# Altium footprint library ICs And Semiconductors SMD.PcbLib: 602 footprints (part 35 of 38)
Each footprint in its own frame and in the unit in brackets; x right, y up, seen from the top. Pads: shape width x height; smd on the part's side, far side on the other; paste and mask are expansions set on the pad; w line width, h text height; cw(c..) or ccw(c..) is an arc to the next point about the centre after c.
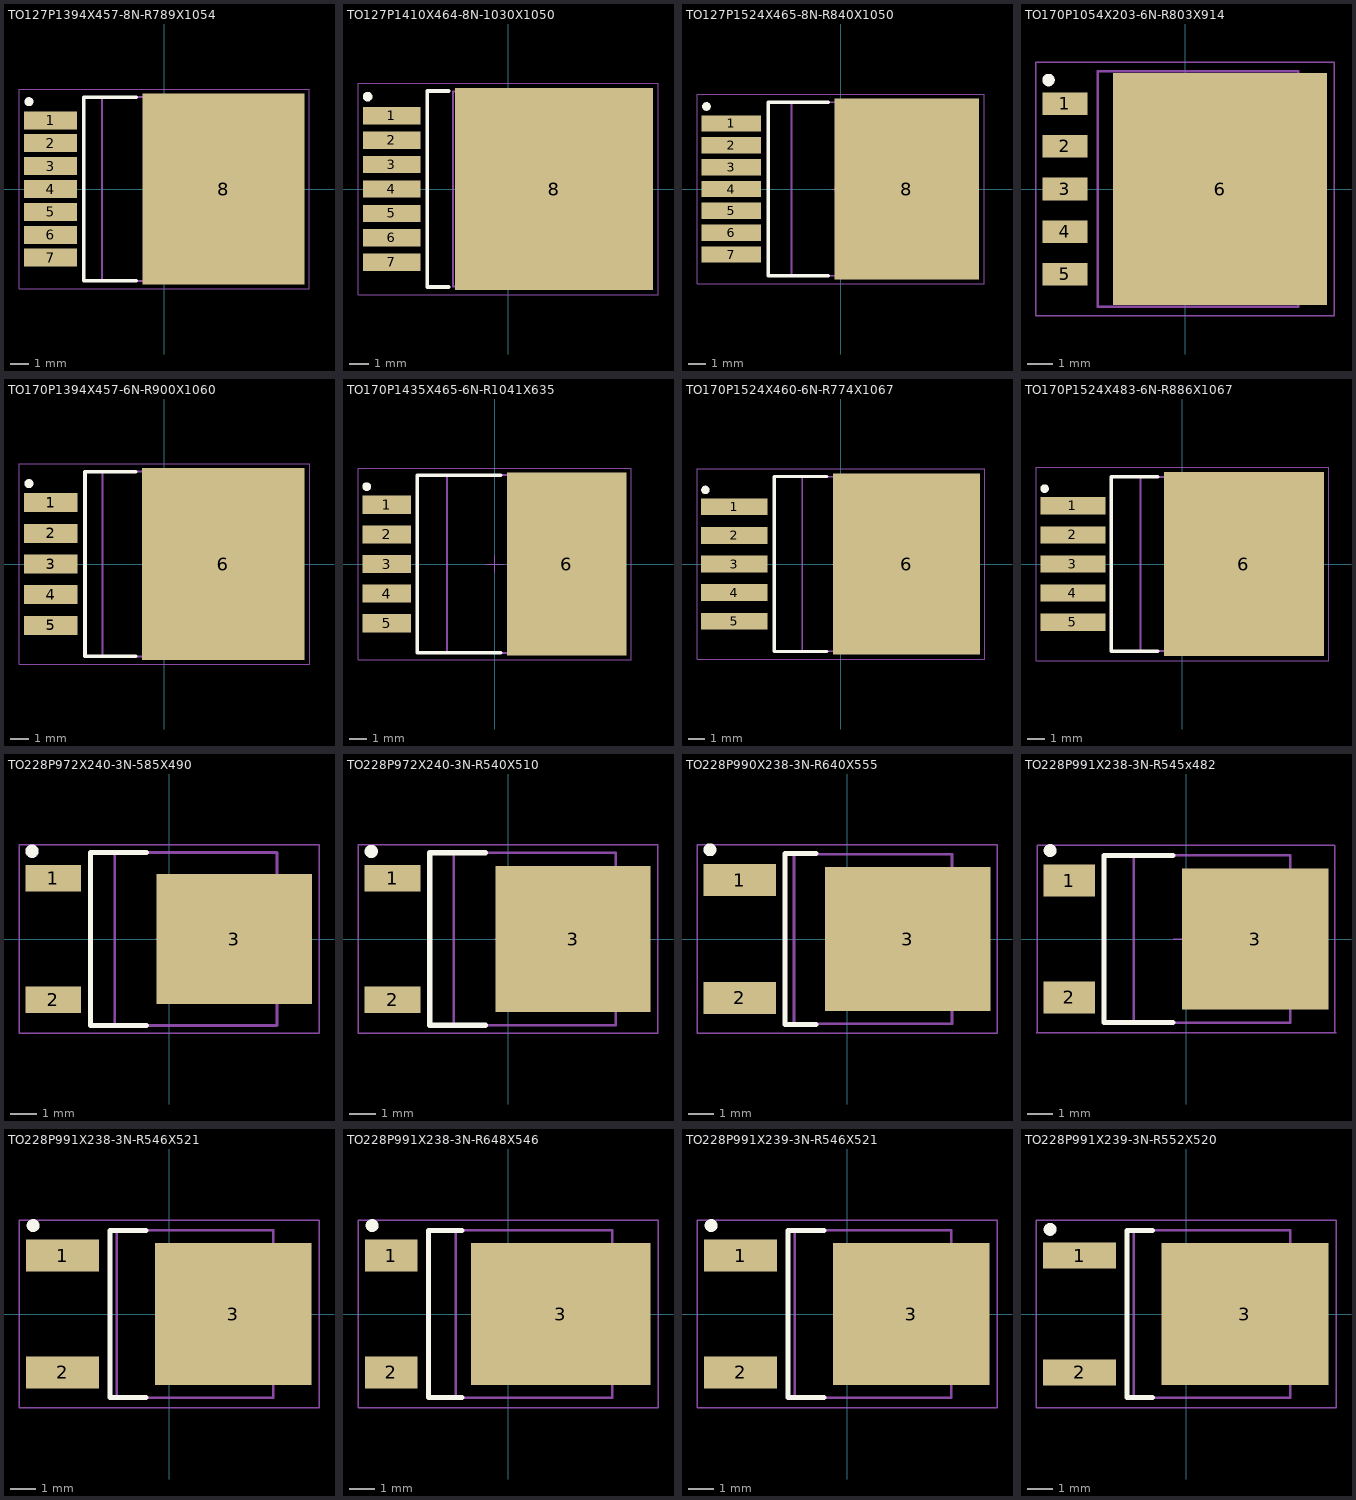
[diagram p34: the footprints below, top view; thin cyan lines are the x and y axes]

## TO127P1394X457-8N-R789X1054 [mm] "TO-263, 7 Leads, 1.70mm pitch; TO, 13.945mm L X 8.89mm W X 4.57mm H body IPC Medium Density"
height 4.57
pads (8):
  rect 2.95x1 smd: 1(-6.3,3.81) 2(-6.3,2.54) 3(-6.3,1.27) 4(-6.3,0) 5(-6.3,-1.27) 6(-6.3,-2.54) 7(-6.3,-3.81)
  rect 9x10.6 smd: 8(3.3,0)
Top Overlay:
  circle w0.25: c-7.5,4.85 r0.125
  lines w0.2: -1.55,-5.1 -4.45,-5.1 -4.45,5.1 -1.55,5.1
Top Paste:
  region: 5.74,3.3 7.1,3.3 7.1,4.7 5.74,4.7
  region: 3.66,3.3 5.02,3.3 5.02,4.7 3.66,4.7
  region: 1.58,3.3 2.94,3.3 2.94,4.7 1.58,4.7
  region: -0.5,3.3 0.86,3.3 0.86,4.7 -0.5,4.7
  region: 5.74,1.3 7.1,1.3 7.1,2.7 5.74,2.7
  region: 3.66,1.3 5.02,1.3 5.02,2.7 3.66,2.7
  region: 1.58,1.3 2.94,1.3 2.94,2.7 1.58,2.7
  region: -0.5,1.3 0.86,1.3 0.86,2.7 -0.5,2.7
  region: 5.74,-0.7 7.1,-0.7 7.1,0.7 5.74,0.7
  region: 3.66,-0.7 5.02,-0.7 5.02,0.7 3.66,0.7
  region: 1.58,-0.7 2.94,-0.7 2.94,0.7 1.58,0.7
  region: -0.5,-0.7 0.86,-0.7 0.86,0.7 -0.5,0.7
  region: 5.74,-2.7 7.1,-2.7 7.1,-1.3 5.74,-1.3
  region: 3.66,-2.7 5.02,-2.7 5.02,-1.3 3.66,-1.3
  region: 1.58,-2.7 2.94,-2.7 2.94,-1.3 1.58,-1.3
  region: -0.5,-2.7 0.86,-2.7 0.86,-1.3 -0.5,-1.3
  region: 5.74,-4.7 7.1,-4.7 7.1,-3.3 5.74,-3.3
  region: 3.66,-4.7 5.02,-4.7 5.02,-3.3 3.66,-3.3
  region: 1.58,-4.7 2.94,-4.7 2.94,-3.3 1.58,-3.3
  region: -0.5,-4.7 0.86,-4.7 0.86,-3.3 -0.5,-3.3
Mechanical 14:
  lines w0.1: 5.452,-5.112 5.954,-5.112 6.972,-3.984 6.972,3.985 5.954,5.113 5.452,5.113 ; -3.438,-5.11 -3.438,5.11 5.453,5.11 5.453,-5.11 -3.438,-5.11
Mechanical 15:
  lines w0.05: -0.5,0 0.5,0 ; 0,-0.5 0,0.5 ; -8.05,-5.55 -8.05,5.55 8.05,5.55 8.05,-5.55 -8.05,-5.55
3D body "TO127P1394X457-8N-R789X1054.stp": height 4.57, standoff 0, extent -7.068,-5.27 7.486,5.271

## TO127P1410X464-8N-1030X1050 [mm] "TO-263, TO,1.27mm pitch;7 pin,14.10mm L X 8.64mm W X 4.64mm H body, IPC Medium Density"
height 4.64
pads (8):
  rect 3x0.9 smd: 1(-6.05,3.81) 2(-6.05,2.54) 3(-6.05,1.27) 4(-6.05,0) 5(-6.05,-1.27) 6(-6.05,-2.54) 7(-6.05,-3.81)
  rect 10.3x10.5 smd: 8(2.4,0)
Top Overlay:
  circle w0.25: c-7.3,4.8 r0.125
  lines w0.2: -3.1,-5.1 -4.2,-5.1 -4.2,5.1 -3.1,5.1
Top Paste:
  region: -1.98,-4.63 -0.36,-4.63 -0.36,-3.29 -1.98,-3.29
  region: 0.4,-4.63 2.02,-4.63 2.02,-3.29 0.4,-3.29
  region: 2.78,-4.63 4.4,-4.63 4.4,-3.29 2.78,-3.29
  region: 5.16,-4.63 6.78,-4.63 6.78,-3.29 5.16,-3.29
  region: -1.98,-2.65 -0.36,-2.65 -0.36,-1.31 -1.98,-1.31
  region: 0.4,-2.65 2.02,-2.65 2.02,-1.31 0.4,-1.31
  region: 2.78,-2.65 4.4,-2.65 4.4,-1.31 2.78,-1.31
  region: 5.16,-2.65 6.78,-2.65 6.78,-1.31 5.16,-1.31
  region: -1.98,-0.67 -0.36,-0.67 -0.36,0.67 -1.98,0.67
  region: 0.4,-0.67 2.02,-0.67 2.02,0.67 0.4,0.67
  region: 2.78,-0.67 4.4,-0.67 4.4,0.67 2.78,0.67
  region: 5.16,-0.67 6.78,-0.67 6.78,0.67 5.16,0.67
  region: -1.98,1.31 -0.36,1.31 -0.36,2.65 -1.98,2.65
  region: 0.4,1.31 2.02,1.31 2.02,2.65 0.4,2.65
  region: 2.78,1.31 4.4,1.31 4.4,2.65 2.78,2.65
  region: 5.16,1.31 6.78,1.31 6.78,2.65 5.16,2.65
  region: -1.98,3.29 -0.36,3.29 -0.36,4.63 -1.98,4.63
  region: 0.4,3.29 2.02,3.29 2.02,4.63 0.4,4.63
  region: 2.78,3.29 4.4,3.29 4.4,4.63 2.78,4.63
  region: 5.16,3.29 6.78,3.29 6.78,4.63 5.16,4.63
Mechanical 14:
  lines w0.1: 5.78,-5.112 6.199,-5.112 7.05,-4.17 7.05,4.17 6.199,5.112 5.78,5.112 ; -2.86,-5.08 5.78,-5.08 5.78,5.08 -2.86,5.08 -2.86,-5.08
Mechanical 15:
  circle w0.05: c0,0 r0.35
  lines w0.05: -0.5,0 0.5,0 ; 0,-0.5 0,0.5 ; -7.8,-5.5 7.8,-5.5 7.8,5.5 -7.8,5.5 -7.8,-5.5
3D body "TO127P1410X464-8N-1030X1050.stp": height 4.57, standoff 0, extent -7.124,-5.08 7.232,5.08

## TO127P1524X465-8N-R840X1050 [mm] "TO, 1.27mm Pitch; 7 Pin, 15.24mm L X 8.89mm W X 4.65mm H Body, IPC Medium Density"
height 4.65
pads (8):
  rect 3.45x0.95 smd: 1(-6.35,3.81) 2(-6.35,2.54) 3(-6.35,1.27) 4(-6.35,0) 5(-6.35,-1.27) 6(-6.35,-2.54) 7(-6.35,-3.81)
  rect 8.4x10.5 smd: 8(3.85,0)
Top Overlay:
  circle w0.25: c-7.8,4.8 r0.125
  lines w0.2: -0.7,-5.05 -4.2,-5.05 -4.2,5.05 -0.7,5.05
Top Paste:
  region: 5.54,3.25 7.2,3.25 7.2,4.67 5.54,4.67
  region: 3.02,3.25 4.68,3.25 4.68,4.67 3.02,4.67
  region: 0.5,3.25 2.16,3.25 2.16,4.67 0.5,4.67
  region: 5.54,1.27 7.2,1.27 7.2,2.69 5.54,2.69
  region: 3.02,1.27 4.68,1.27 4.68,2.69 3.02,2.69
  region: 0.5,1.27 2.16,1.27 2.16,2.69 0.5,2.69
  region: 5.54,-0.71 7.2,-0.71 7.2,0.71 5.54,0.71
  region: 3.02,-0.71 4.68,-0.71 4.68,0.71 3.02,0.71
  region: 0.5,-0.71 2.16,-0.71 2.16,0.71 0.5,0.71
  region: 5.54,-2.69 7.2,-2.69 7.2,-1.27 5.54,-1.27
  region: 3.02,-2.69 4.68,-2.69 4.68,-1.27 3.02,-1.27
  region: 0.5,-2.69 2.16,-2.69 2.16,-1.27 0.5,-1.27
  region: 5.54,-4.67 7.2,-4.67 7.2,-3.25 5.54,-3.25
  region: 3.02,-4.67 4.68,-4.67 4.68,-3.25 3.02,-3.25
  region: 0.5,-4.67 2.16,-4.67 2.16,-3.25 0.5,-3.25
Mechanical 14:
  lines w0.1: 6.04,5.047 6.561,5.047 7.62,3.874 7.62,-3.875 6.561,-5.048 6.04,-5.048 ; 6.04,-5.048 6.04,5.048 -2.85,5.048 -2.85,-5.048 6.04,-5.048
Mechanical 15:
  circle w0.05: c0,0 r0.35
  lines w0.05: -0.5,0 0.5,0 ; 0,-0.5 0,0.5 ; -8.35,-5.5 -8.35,5.5 8.35,5.5 8.35,-5.5 -8.35,-5.5
3D body "TO127P1524X465-8N-R840X1050.stp": height 4.65, standoff 0, extent -7.685,-5.205 7.685,5.205

## TO170P1054X203-6N-R803X914 [mm] "TO, 1.70mm Pitch; 5 Pin,10.54mm L X 8.00mm W X 2.03mm H body, IPC Medium Density"
height 2.03
pads (6):
  rect 1.8x0.9 smd: 1(-4.8,3.4) 2(-4.8,1.7) 3(-4.8,0) 4(-4.8,-1.7) 5(-4.8,-3.4)
  rect 8.55x9.25 smd: 6(1.4,0)
Top Overlay:
  circle w0.25: c-5.45,4.35 r0.125
Top Paste:
  region: -2.23,-3.99 -0.91,-3.99 -0.91,-2.49 -2.23,-2.49
  region: -0.25,-3.99 1.07,-3.99 1.07,-2.49 -0.25,-2.49
  region: 1.73,-3.99 3.05,-3.99 3.05,-2.49 1.73,-2.49
  region: 3.71,-3.99 5.03,-3.99 5.03,-2.49 3.71,-2.49
  region: -2.23,-1.83 -0.91,-1.83 -0.91,-0.33 -2.23,-0.33
  region: -0.25,-1.83 1.07,-1.83 1.07,-0.33 -0.25,-0.33
  region: 1.73,-1.83 3.05,-1.83 3.05,-0.33 1.73,-0.33
  region: 3.71,-1.83 5.03,-1.83 5.03,-0.33 3.71,-0.33
  region: -2.23,0.33 -0.91,0.33 -0.91,1.83 -2.23,1.83
  region: -0.25,0.33 1.07,0.33 1.07,1.83 -0.25,1.83
  region: 1.73,0.33 3.05,0.33 3.05,1.83 1.73,1.83
  region: 3.71,0.33 5.03,0.33 5.03,1.83 3.71,1.83
  region: -2.23,2.49 -0.91,2.49 -0.91,3.99 -2.23,3.99
  region: -0.25,2.49 1.07,2.49 1.07,3.99 -0.25,3.99
  region: 1.73,2.49 3.05,2.49 3.05,3.99 1.73,3.99
  region: 3.71,2.49 5.03,2.49 5.03,3.99 3.71,3.99
Mechanical 14:
  lines w0.1: 4.51,-4.508 4.761,-4.508 5.27,-3.944 5.27,3.943 4.761,4.507 4.51,4.507 ; -3.49,-4.698 4.51,-4.698 4.51,4.698 -3.49,4.698 -3.49,-4.698
Mechanical 15:
  circle w0.05: c0,0 r0.35
  lines w0.05: -0.5,0 0.5,0 ; 0,-0.5 0,0.5 ; -5.95,-5.05 5.95,-5.05 5.95,5.05 -5.95,5.05 -5.95,-5.05
3D body "TO170P1054X203-6N-R803X914.stp": height 1.92, standoff 0, extent -5.226,-4.76 5.227,4.76

## TO170P1394X457-6N-R900X1060 [mm] "TO, 1.70mm Pitch; 5 Pin, 13.945mm L X 8.89mm W X 4.572mm H body, IPC Medium Density"
height 4.57
pads (6):
  rect 2.95x1.05 smd: 1(-6.3,3.4) 2(-6.3,1.7) 3(-6.3,0) 4(-6.3,-1.7) 5(-6.3,-3.4)
  rect 9x10.6 smd: 6(3.25,0)
Top Overlay:
  circle w0.25: c-7.5,4.45 r0.125
  lines w0.2: -1.6,-5.1 -4.4,-5.1 -4.4,5.1 -1.6,5.1
Top Paste:
  region: -0.55,-4.7 0.81,-4.7 0.81,-3.3 -0.55,-3.3
  region: 1.53,-4.7 2.89,-4.7 2.89,-3.3 1.53,-3.3
  region: 3.61,-4.7 4.97,-4.7 4.97,-3.3 3.61,-3.3
  region: 5.69,-4.7 7.05,-4.7 7.05,-3.3 5.69,-3.3
  region: -0.55,-2.7 0.81,-2.7 0.81,-1.3 -0.55,-1.3
  region: 1.53,-2.7 2.89,-2.7 2.89,-1.3 1.53,-1.3
  region: 3.61,-2.7 4.97,-2.7 4.97,-1.3 3.61,-1.3
  region: 5.69,-2.7 7.05,-2.7 7.05,-1.3 5.69,-1.3
  region: -0.55,-0.7 0.81,-0.7 0.81,0.7 -0.55,0.7
  region: 1.53,-0.7 2.89,-0.7 2.89,0.7 1.53,0.7
  region: 3.61,-0.7 4.97,-0.7 4.97,0.7 3.61,0.7
  region: 5.69,-0.7 7.05,-0.7 7.05,0.7 5.69,0.7
  region: -0.55,1.3 0.81,1.3 0.81,2.7 -0.55,2.7
  region: 1.53,1.3 2.89,1.3 2.89,2.7 1.53,2.7
  region: 3.61,1.3 4.97,1.3 4.97,2.7 3.61,2.7
  region: 5.69,1.3 7.05,1.3 7.05,2.7 5.69,2.7
  region: -0.55,3.3 0.81,3.3 0.81,4.7 -0.55,4.7
  region: 1.53,3.3 2.89,3.3 2.89,4.7 1.53,4.7
  region: 3.61,3.3 4.97,3.3 4.97,4.7 3.61,4.7
  region: 5.69,3.3 7.05,3.3 7.05,4.7 5.69,4.7
Mechanical 14:
  lines w0.1: 5.452,-5.112 -3.438,-5.112 -3.438,5.112 5.452,5.112 ; 5.452,-5.112 5.452,5.112 ; 5.452,-5.112 5.954,-5.112 6.972,-3.984 6.972,3.983 5.954,5.112 5.452,5.112
Mechanical 15:
  circle w0.05: c0,0 r0.35
  lines w0.05: -0.5,0 0.5,0 ; 0,-0.5 0,0.5 ; -8.05,-5.55 8.05,-5.55 8.05,5.55 -8.05,5.55 -8.05,-5.55
3D body "TO170P1394X457-6N-R900X1060.stp": height 4.63, standoff 0, extent -6.935,-5.27 7.111,5.27

## TO170P1435X465-6N-R1041X635 [mm] "TO-263, 5 Leads, 1.70mm pitch; TO, 14.35mm L X 8.64mm W X 4.65mm H body IPC Medium Density"
height 4.65
pads (6):
  rect 2.8x1.05 smd: 1(-6.2,3.4) 2(-6.2,1.7) 3(-6.2,0) 4(-6.2,-1.7) 5(-6.2,-3.4)
  rect 6.85x10.5 smd: 6(4.15,0)
Top Overlay:
  circle w0.25: c-7.35,4.45 r0.125
  lines w0.2: 0.35,-5.1 -4.45,-5.1 -4.45,5.1 0.35,5.1
Top Paste:
  region: 1.47,-4.75 2.75,-4.75 2.75,-3.25 1.47,-3.25
  region: 3.51,-4.75 4.79,-4.75 4.79,-3.25 3.51,-3.25
  region: 5.55,-4.75 6.83,-4.75 6.83,-3.25 5.55,-3.25
  region: 1.47,-2.75 2.75,-2.75 2.75,-1.25 1.47,-1.25
  region: 3.51,-2.75 4.79,-2.75 4.79,-1.25 3.51,-1.25
  region: 5.55,-2.75 6.83,-2.75 6.83,-1.25 5.55,-1.25
  region: 1.47,-0.75 2.75,-0.75 2.75,0.75 1.47,0.75
  region: 3.51,-0.75 4.79,-0.75 4.79,0.75 3.51,0.75
  region: 5.55,-0.75 6.83,-0.75 6.83,0.75 5.55,0.75
  region: 1.47,1.25 2.75,1.25 2.75,2.75 1.47,2.75
  region: 3.51,1.25 4.79,1.25 4.79,2.75 3.51,2.75
  region: 5.55,1.25 6.83,1.25 6.83,2.75 5.55,2.75
  region: 1.47,3.25 2.75,3.25 2.75,4.75 1.47,4.75
  region: 3.51,3.25 4.79,3.25 4.79,4.75 3.51,4.75
  region: 5.55,3.25 6.83,3.25 6.83,4.75 5.55,4.75
Mechanical 14:
  lines w0.1: 5.905,-5.112 6.324,-5.112 7.175,-4.17 7.175,4.17 6.324,5.112 5.905,5.112 ; 5.905,-5.112 5.905,5.112 ; 5.905,-5.112 -2.735,-5.112 -2.735,5.112 5.905,5.112
Mechanical 15:
  lines w0.05: -7.8,-5.5 7.8,-5.5 ; -7.8,5.5 7.8,5.5 ; -0.5,0 0.5,0 ; 0,-0.5 0,0.5 ; -7.85,-5.5 -7.85,5.5 7.85,5.5 7.85,-5.5 -7.85,-5.5
3D body "TO170P1435X465-6N-R1041X635.stp": height 4.64, standoff -0.01, extent -7.11,-5.205 7.24,5.205

## TO170P1524X460-6N-R774X1067 [mm] "DDPAK TO-263, TO, 1.70mm Pitch; 5 Pin, 15.24mm L X 8.781mm W X 4.597mm H body, IPC Medium Density"
height 4.6
pads (6):
  rect 3.95x1 smd: 1(-6.35,3.4) 2(-6.35,1.7) 3(-6.35,0) 4(-6.35,-1.7) 5(-6.35,-3.4)
  rect 8.75x10.75 smd: 6(3.9,0)
Top Overlay:
  circle w0.25: c-8.05,4.4 r0.125
  lines w0.2: -0.85,-5.2 -3.95,-5.2 -3.95,5.2 -0.85,5.2
Top Paste:
  region: 6.25,3.32 7.55,3.32 7.55,4.76 6.25,4.76
  region: 4.25,3.32 5.55,3.32 5.55,4.76 4.25,4.76
  region: 2.25,3.32 3.55,3.32 3.55,4.76 2.25,4.76
  region: 0.25,3.32 1.55,3.32 1.55,4.76 0.25,4.76
  region: 6.25,1.3 7.55,1.3 7.55,2.74 6.25,2.74
  region: 4.25,1.3 5.55,1.3 5.55,2.74 4.25,2.74
  region: 2.25,1.3 3.55,1.3 3.55,2.74 2.25,2.74
  region: 0.25,1.3 1.55,1.3 1.55,2.74 0.25,2.74
  region: 6.25,-0.72 7.55,-0.72 7.55,0.72 6.25,0.72
  region: 4.25,-0.72 5.55,-0.72 5.55,0.72 4.25,0.72
  region: 2.25,-0.72 3.55,-0.72 3.55,0.72 2.25,0.72
  region: 0.25,-0.72 1.55,-0.72 1.55,0.72 0.25,0.72
  region: 6.25,-2.74 7.55,-2.74 7.55,-1.3 6.25,-1.3
  region: 4.25,-2.74 5.55,-2.74 5.55,-1.3 4.25,-1.3
  region: 2.25,-2.74 3.55,-2.74 3.55,-1.3 2.25,-1.3
  region: 0.25,-2.74 1.55,-2.74 1.55,-1.3 0.25,-1.3
  region: 6.25,-4.76 7.55,-4.76 7.55,-3.32 6.25,-3.32
  region: 4.25,-4.76 5.55,-4.76 5.55,-3.32 4.25,-3.32
  region: 2.25,-4.76 3.55,-4.76 3.55,-3.32 2.25,-3.32
  region: 0.25,-4.76 1.55,-4.76 1.55,-3.32 0.25,-3.32
Mechanical 14:
  lines w0.1: 6.477,-5.182 6.854,-5.182 7.62,-4.332 7.62,4.332 6.854,5.182 6.477,5.182 ; 6.477,-5.182 6.477,5.182 ; 6.477,-5.182 -2.304,-5.182 -2.304,5.182 6.477,5.182
  text "1" at 0.45,-0.164 h0.75
Mechanical 15:
  circle w0.05: c0,0 r0.35
  lines w0.05: -0.5,0 0.5,0 ; 0,-0.5 0,0.5 ; -8.55,-5.65 -8.55,5.65 8.55,5.65 8.55,-5.65 -8.55,-5.65
3D body "TO170P1524X460-6N-R774X1067.stp": height 4.59, standoff -0.01, extent -7.94,-5.335 7.935,5.335

## TO170P1524X483-6N-R886X1067 [mm] "DDPAK TO-263, TO, 1.70mm pitch; 5 pin, 15.24mm L X 8.925mm W X 4.83mm H body, IPC Medium Density"
height 4.83
pads (6):
  rect 3.8x1 smd: 1(-6.4,3.4) 2(-6.4,1.7) 3(-6.4,0) 4(-6.4,-1.7) 5(-6.4,-3.4)
  rect 9.35x10.75 smd: 6(3.6,0)
Top Overlay:
  circle w0.25: c-8.05,4.4 r0.125
  lines w0.2: -1.45,-5.1 -4.15,-5.1 -4.15,5.1 -1.45,5.1
Top Paste:
  region: -0.35,-4.79 -0.35,-3.37 1.07,-3.37 1.07,-4.79
  region: 1.81,-4.79 1.81,-3.37 3.23,-3.37 3.23,-4.79
  region: 3.97,-4.79 3.97,-3.37 5.39,-3.37 5.39,-4.79
  region: 6.13,-4.79 6.13,-3.37 7.55,-3.37 7.55,-4.79
  region: -0.35,-2.75 -0.35,-1.33 1.07,-1.33 1.07,-2.75
  region: 1.81,-2.75 1.81,-1.33 3.23,-1.33 3.23,-2.75
  region: 3.97,-2.75 3.97,-1.33 5.39,-1.33 5.39,-2.75
  region: 6.13,-2.75 6.13,-1.33 7.55,-1.33 7.55,-2.75
  region: -0.35,-0.71 -0.35,0.71 1.07,0.71 1.07,-0.71
  region: 1.81,-0.71 1.81,0.71 3.23,0.71 3.23,-0.71
  region: 3.97,-0.71 3.97,0.71 5.39,0.71 5.39,-0.71
  region: 6.13,-0.71 6.13,0.71 7.55,0.71 7.55,-0.71
  region: -0.35,1.33 -0.35,2.75 1.07,2.75 1.07,1.33
  region: 1.81,1.33 1.81,2.75 3.23,2.75 3.23,1.33
  region: 3.97,1.33 3.97,2.75 5.39,2.75 5.39,1.33
  region: 6.13,1.33 6.13,2.75 7.55,2.75 7.55,1.33
  region: -0.35,3.37 -0.35,4.79 1.07,4.79 1.07,3.37
  region: 1.81,3.37 1.81,4.79 3.23,4.79 3.23,3.37
  region: 3.97,3.37 3.97,4.79 5.39,4.79 5.39,3.37
  region: 6.13,3.37 6.13,4.79 7.55,4.79 7.55,3.37
Mechanical 14:
  lines w0.1: 6.48,-5.08 -2.445,-5.08 -2.445,5.08 6.48,5.08 ; 6.48,-5.08 6.48,5.08 ; 6.48,-5.08 6.856,-5.08 7.62,-4.234 7.62,4.234 6.856,5.08 6.48,5.08
Mechanical 15:
  circle w0.05: c0,0 r0.35
  lines w0.05: -0.5,0 0.5,0 ; 0,-0.5 0,0.5 ; -8.55,-5.65 8.55,-5.65 8.55,5.65 -8.55,5.65 -8.55,-5.65
3D body "TO170P1524X483-6N-R886X1067.stp": height 4.83, standoff -0.01, extent -7.732,-5.335 8.148,5.335

## TO228P972X240-3N-585X490 [mm] "DPAK TO-252, 2.28mm pitch; 2 pin, 9.725mm L X 6.10mm W X 2.40mm H body, IPC Medium Density"
height 2.4
pads (3):
  rect 2.1x1 smd: 1(-4.35,2.28) 2(-4.35,-2.28)
  rect 5.85x4.9 smd: 3(2.45,0)
Top Overlay:
  circle w0.25: c-5.15,3.3 r0.125
  lines w0.2: -0.85,-3.25 -2.95,-3.25 -2.95,3.25 -0.85,3.25
Top Paste:
  region: 0.18,-1.81 2.12,-1.81 2.12,-0.33 0.18,-0.33
  region: 2.78,-1.81 4.72,-1.81 4.72,-0.33 2.78,-0.33
  region: 0.18,0.33 2.12,0.33 2.12,1.81 0.18,1.81
  region: 2.78,0.33 4.72,0.33 4.72,1.81 2.78,1.81
Mechanical 14:
  lines w0.1: 4.062,-2.35 4.326,-2.35 4.863,-1.756 4.863,1.756 4.327,2.35 4.063,2.35 ; -2.037,-3.25 4.062,-3.25 4.062,3.25 -2.037,3.25 -2.037,-3.25
Mechanical 15:
  circle w0.05: c0,0 r0.35
  lines w0.05: -0.5,0 0.5,0 ; 0,-0.5 0,0.5 ; -5.64,-3.55 5.64,-3.55 5.64,3.55 -5.64,3.55 -5.64,-3.55
3D body "TO228P972X240-3N-R540X510.stp": height 2.4, standoff 0, extent -4.9,-3.3 4.82,3.3

## TO228P972X240-3N-R540X510 [mm] "DPAK TO-252, 2.28mm pitch; 2 pin, 9.725mm L X 6.10mm W X 2.40mm H body, IPC Medium Density"
height 2.4
pads (3):
  rect 2.1x1 smd: 1(-4.35,2.28) 2(-4.35,-2.28)
  rect 5.85x5.5 smd: 3(2.45,0)
Top Overlay:
  circle w0.25: c-5.15,3.3 r0.125
  lines w0.2: -0.85,-3.25 -2.95,-3.25 -2.95,3.25 -0.85,3.25
Top Paste:
  region: 0.22,-2.05 2.1,-2.05 2.1,-0.35 0.22,-0.35
  region: 2.8,-2.05 4.68,-2.05 4.68,-0.35 2.8,-0.35
  region: 0.22,0.35 2.1,0.35 2.1,2.05 0.22,2.05
  region: 2.8,0.35 4.68,0.35 4.68,2.05 2.8,2.05
Mechanical 14:
  lines w0.1: 4.062,-2.65 4.326,-2.65 4.863,-2.056 4.863,2.056 4.327,2.65 4.063,2.65 ; -2.037,-3.25 -2.037,3.25 4.062,3.25 4.062,-3.25 -2.037,-3.25
Mechanical 15:
  lines w0.05: -0.5,0 0.5,0 ; 0,-0.5 0,0.5 ; -5.65,-3.55 -5.65,3.55 5.65,3.55 5.65,-3.55 -5.65,-3.55
3D body "TO228P972X240-3N-R540X510.stp": height 2.4, standoff 0, extent -4.9,-3.3 4.82,3.3

## TO228P990X238-3N-R640X555 [mm] "TO-252AA DPAK TO, 2.28mm pitch; 2 pin,9.90mm L X 6.56mm W X 2.38mm H body, IPC Medium Density"
height 2.38
pads (3):
  rect 2.8x1.25 smd: 1(-4.15,2.28) 2(-4.15,-2.28)
  rect 6.4x5.55 smd: 3(2.35,0)
Top Overlay:
  circle w0.25: c-5.3,3.45 r0.125
  lines w0.2: -1.2,-3.3 -2.4,-3.3 -2.4,3.3 -1.2,3.3
Top Paste:
  region: -0.11,-2.04 1.99,-2.04 1.99,-0.36 -0.11,-0.36
  region: 2.71,-2.04 4.81,-2.04 4.81,-0.36 2.71,-0.36
  region: -0.11,0.36 1.99,0.36 1.99,2.04 -0.11,2.04
  region: 2.71,0.36 4.81,0.36 4.81,2.04 2.71,2.04
Mechanical 14:
  lines w0.1: 4.06,-2.668 4.354,-2.668 4.95,-2.006 4.95,2.006 4.354,2.668 4.06,2.668 ; -2.05,-3.282 4.06,-3.282 4.06,3.282 -2.05,3.282 -2.05,-3.282
Mechanical 15:
  circle w0.05: c0,0 r0.35
  lines w0.05: -0.5,0 0.5,0 ; 0,-0.5 0,0.5 ; -5.8,-3.65 5.8,-3.65 5.8,3.65 -5.8,3.65 -5.8,-3.65
3D body "TO228P990X238-3N-R640X555.stp": height 2.28, standoff 0, extent -4.992,-3.27 4.946,3.27

## TO228P991X238-3N-R545x482 [mm] "TO-252AA DPAK, TO, 2.28mm pitch; 2 pin,9.91mm L X 6.095mm W X 2.38mm H body, IPC Medium Density"
height 2.38
pads (3):
  rect 2x1.25 smd: 1(-4.55,2.28) 2(-4.55,-2.28)
  rect 5.7x5.5 smd: 3(2.7,0)
Top Overlay:
  circle w0.25: c-5.3,3.45 r0.125
  lines w0.2: -0.5,-3.25 -3.2,-3.25 -3.2,3.25 -0.5,3.25
Top Paste:
  region: 0.54,-2.06 2.36,-2.06 2.36,-0.34 0.54,-0.34
  region: 3.04,-2.06 4.86,-2.06 4.86,-0.34 3.04,-0.34
  region: 0.54,0.34 2.36,0.34 2.36,2.06 0.54,2.06
  region: 3.04,0.34 4.86,0.34 4.86,2.06 3.04,2.06
Mechanical 14:
  lines w0.1: 4.065,-2.505 4.359,-2.505 4.955,-1.844 4.955,1.844 4.359,2.505 4.065,2.505 ; -2.03,-3.27 -2.03,3.27 4.065,3.27 4.065,-3.27 -2.03,-3.27
Mechanical 15:
  lines w0.05: -5.85,-3.65 5.85,-3.65 ; -0.5,0 0.5,0 ; 0,-0.5 0,0.5 ; -5.8,-3.65 -5.8,3.65 5.8,3.65 5.8,-3.65 -5.8,-3.65
3D body "TO228P991X238-3AN.stp": height 2.44, standoff -0.06, extent -5.222,-3.365 5.198,3.365

## TO228P991X238-3N-R546X521 [mm] "TO-252AA DPAK TO, 2.28mm pitch; 2 pin,9.905mm L X 6.095mm W X 2.38mm H body, IPC Medium Density"
height 2.39
pads (3):
  rect 2.85x1.25 smd: 1(-4.15,2.28) 2(-4.15,-2.28)
  rect 6.1x5.55 smd: 3(2.5,0)
Top Overlay:
  circle w0.25: c-5.3,3.45 r0.125
  lines w0.2: -0.9,-3.25 -2.3,-3.25 -2.3,3.25 -0.9,3.25
Top Paste:
  region: 2.86,0.36 4.84,0.36 4.84,2.06 2.86,2.06
  region: 0.16,0.36 2.14,0.36 2.14,2.06 0.16,2.06
  region: 2.86,-2.06 4.84,-2.06 4.84,-0.36 2.86,-0.36
  region: 0.16,-2.06 2.14,-2.06 2.14,-0.36 0.16,-0.36
Mechanical 14:
  lines w0.1: 4.062,-2.602 4.356,-2.602 4.952,-1.942 4.952,1.942 4.356,2.602 4.062,2.602 ; -2.032,-3.27 4.062,-3.27 4.062,3.27 -2.032,3.27 -2.032,-3.27
Mechanical 15:
  lines w0.05: -0.5,0 0.5,0 ; 0,-0.5 0,0.5 ; -5.85,-3.65 5.85,-3.65 5.85,3.65 -5.85,3.65 -5.85,-3.65
3D body: height 1.9, standoff 1.5, extent -3.824,1.831 -1.9,2.729
3D body: height 1.5, standoff 0.6, extent -3.824,1.831 -3.449,2.729
3D body: height 0.6, standoff 0, extent -4.999,1.831 -3.449,2.729
3D body: height 0.6, standoff 0, extent -4.999,-2.729 -3.449,-1.831
3D body: height 1.5, standoff 0.6, extent -3.824,-2.729 -3.449,-1.831
3D body: height 1.9, standoff 1.5, extent -3.824,-2.729 -1.9,-1.831
3D body: height 1.9, standoff 1.5, extent -2.499,-0.449 -1.9,0.449
3D body: height 0.6, standoff 0, extent 4.32,-2.7 5.27,2.7
3D body: height 2.38, standoff 0, extent -1.9,-3.375 4.32,3.375

## TO228P991X238-3N-R648X546 [mm] "TO-252AA DPAK TO, 2.28mm pitch; 2 pin,9.91mm L X 6.095mm W X 2.38mm H body, IPC Medium Density"
height 2.38
pads (3):
  rect 2.05x1.25 smd: 1(-4.55,2.28) 2(-4.55,-2.28)
  rect 7x5.55 smd: 3(2.05,0)
Top Overlay:
  circle w0.25: c-5.3,3.45 r0.125
  lines w0.2: -1.8,-3.25 -3.1,-3.25 -3.1,3.25 -1.8,3.25
Top Paste:
  region: -0.88,-2.02 0.7,-2.02 0.7,-0.38 -0.88,-0.38
  region: 1.26,-2.02 2.84,-2.02 2.84,-0.38 1.26,-0.38
  region: 3.4,-2.02 4.98,-2.02 4.98,-0.38 3.4,-0.38
  region: -0.88,0.38 0.7,0.38 0.7,2.02 -0.88,2.02
  region: 1.26,0.38 2.84,0.38 2.84,2.02 1.26,2.02
  region: 3.4,0.38 4.98,0.38 4.98,2.02 3.4,2.02
Mechanical 14:
  lines w0.1: 4.065,-2.668 4.359,-2.668 4.955,-2.006 4.955,2.006 4.359,2.668 4.065,2.668 ; -2.03,-3.27 -2.03,3.27 4.065,3.27 4.065,-3.27 -2.03,-3.27
Mechanical 15:
  lines w0.05: -0.5,0 0.5,0 ; 0,-0.5 0,0.5 ; -5.85,-3.65 -5.85,3.65 5.85,3.65 5.85,-3.65 -5.85,-3.65
3D body: height 1.9, standoff 1.5, extent -3.824,1.831 -1.9,2.729
3D body: height 1.5, standoff 0.6, extent -3.824,1.831 -3.449,2.729
3D body: height 0.6, standoff 0, extent -4.999,1.831 -3.449,2.729
3D body: height 0.6, standoff 0, extent -4.999,-2.729 -3.449,-1.831
3D body: height 1.5, standoff 0.6, extent -3.824,-2.729 -3.449,-1.831
3D body: height 1.9, standoff 1.5, extent -3.824,-2.729 -1.9,-1.831
3D body: height 1.9, standoff 1.5, extent -2.499,-0.449 -1.9,0.449
3D body: height 0.6, standoff 0, extent 4.32,-2.7 5.27,2.7
3D body: height 2.38, standoff 0, extent -1.9,-3.375 4.32,3.375

## TO228P991X239-3N-R546X521 [mm] "TO-252AA DPAK TO, 2.28mm pitch; 2 pin,9.905mm L X 6.095mm W X 2.39mm H body, IPC Medium Density"
height 2.39
pads (3):
  rect 2.85x1.25 smd: 1(-4.15,2.28) 2(-4.15,-2.28)
  rect 6.1x5.55 smd: 3(2.5,0)
Top Overlay:
  circle w0.25: c-5.3,3.45 r0.125
  lines w0.2: -0.9,-3.25 -2.3,-3.25 -2.3,3.25 -0.9,3.25
Top Paste:
  region: 0.16,-2.06 2.14,-2.06 2.14,-0.36 0.16,-0.36
  region: 2.86,-2.06 4.84,-2.06 4.84,-0.36 2.86,-0.36
  region: 0.16,0.36 2.14,0.36 2.14,2.06 0.16,2.06
  region: 2.86,0.36 4.84,0.36 4.84,2.06 2.86,2.06
Mechanical 14:
  lines w0.1: 4.062,-2.602 4.356,-2.602 4.952,-1.942 4.952,1.942 4.356,2.602 4.062,2.602 ; -2.032,-3.27 -2.032,3.27 4.062,3.27 4.062,-3.27 -2.032,-3.27
Mechanical 15:
  lines w0.05: -0.5,0 0.5,0 ; 0,-0.5 0,0.5 ; -5.85,-3.65 -5.85,3.65 5.85,3.65 5.85,-3.65 -5.85,-3.65
3D body "TO228P991X239-3N-R546X521.stp": height 2.28, standoff 0, extent -4.992,-3.27 4.946,3.27

## TO228P991X239-3N-R552X520 [mm] "TO-252AA DPAK TO, 2.28mm pitch; 2 pin,9.905mm L X 6.095mm W X 2.39mm H body, IPC Medium Density"
height 2.39
pads (3):
  rect 2.85x1 smd: 1(-4.15,2.28) 2(-4.15,-2.28)
  rect 6.5x5.55 smd: 3(2.3,0)
Top Overlay:
  circle w0.25: c-5.3,3.3 r0.125
  lines w0.2: -1.3,-3.25 -2.3,-3.25 -2.3,3.25 -1.3,3.25
Top Paste:
  region: 3.56,0.37 5,0.37 5,2.05 3.56,2.05
  region: 1.58,0.37 3.02,0.37 3.02,2.05 1.58,2.05
  region: -0.4,0.37 1.04,0.37 1.04,2.05 -0.4,2.05
  region: 3.56,-2.05 5,-2.05 5,-0.37 3.56,-0.37
  region: 1.58,-2.05 3.02,-2.05 3.02,-0.37 1.58,-0.37
  region: -0.4,-2.05 1.04,-2.05 1.04,-0.37 -0.4,-0.37
Mechanical 14:
  lines w0.1: 4.062,-2.602 4.356,-2.602 4.952,-1.942 4.952,1.942 4.356,2.602 4.062,2.602 ; -2.032,-3.27 -2.032,3.27 4.062,3.27 4.062,-3.27 -2.032,-3.27
Mechanical 15:
  lines w0.05: -0.5,0 0.5,0 ; 0,-0.5 0,0.5 ; -5.85,-3.65 -5.85,3.65 5.85,3.65 5.85,-3.65 -5.85,-3.65
3D body "TO228P991X239-3N-R552X520.stp": height 2.45, standoff -0.06, extent -5.222,-3.365 5.198,3.365